# Altium footprint library My_Intlib.PcbLib: 224 footprints (part 11 of 14)
Each footprint in its own frame and in the unit in brackets; x right, y up, seen from the top. Pads: shape width x height; smd on the part's side, far side on the other; paste and mask are expansions set on the pad; w line width, h text height; cw(c..) or ccw(c..) is an arc to the next point about the centre after c.
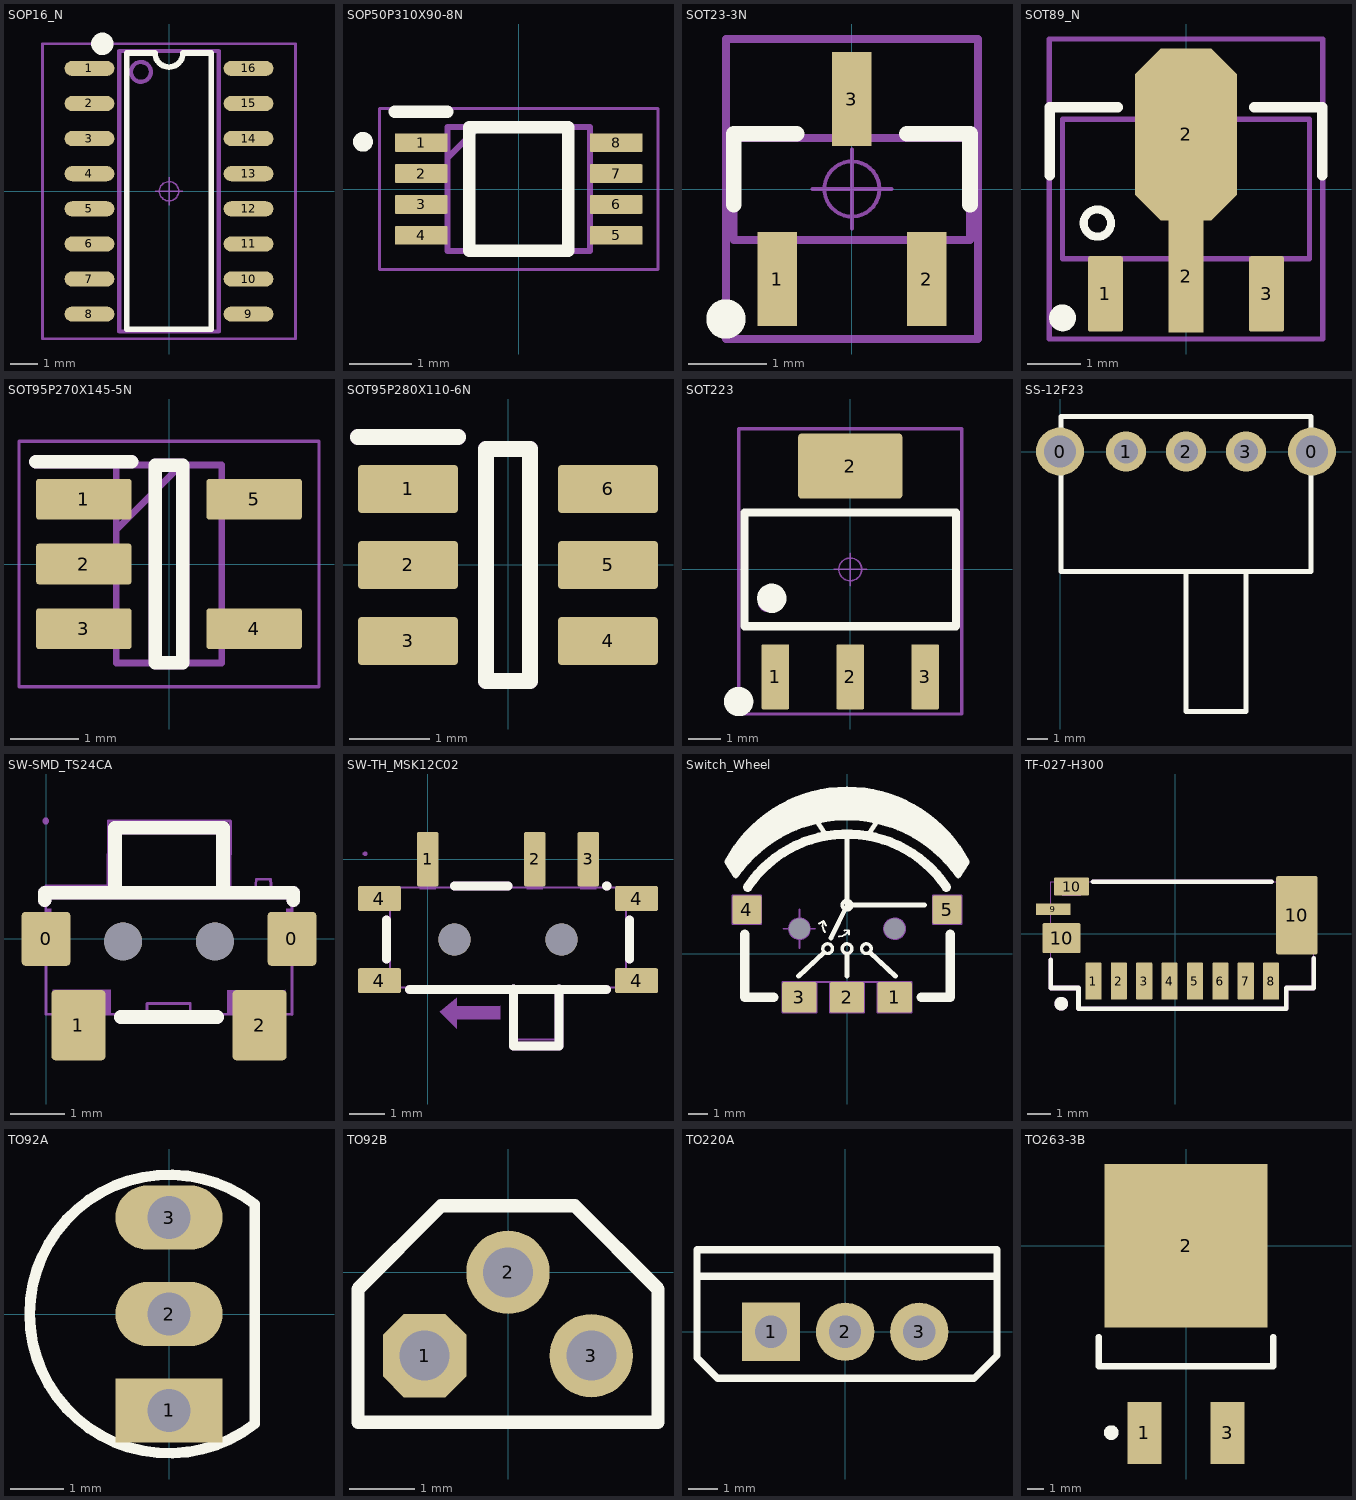
[diagram p10: the footprints below, top view; thin cyan lines are the x and y axes]

## SOP16_N [mm] "10.3*6.2*1.8mm（长宽高）"
height 1.75
pads (16):
  oval 1.8x0.55 smd: 1(-2.877,4.445) 2(-2.877,3.175) 3(-2.877,1.905) 4(-2.877,0.635) 5(-2.877,-0.635) 6(-2.877,-1.905) 7(-2.877,-3.175) 8(-2.877,-4.445) 9(2.877,-4.445) 10(2.877,-3.175) 11(2.877,-1.905) 12(2.877,-0.635) 13(2.877,0.635) 14(2.877,1.905) 15(2.877,3.175) 16(2.877,4.445)
Top Overlay:
  circle w0.5: c-2.413,5.334 r0.155
  lines w0.2: -1.524,5 -1.524,-5 1.524,-5 1.524,5
  lines w0.203: -1.524,5 -0.508,5 ccw(c0,5) 0,4.492 ccw(c0,5) 0.508,5 1.524,5
Top Value:
  text ".Comment" at 4.724,0.532 h0.89
Top Assembly:
  text ".Designator" at 4.724,1.326 h0.89
Mechanical 13:
  circle w0.15: c-1.016,4.318 r0.359
  lines w0.15: -1.8,-5.08 1.8,-5.08 1.8,5.08 -1.8,5.08 -1.8,-5.08
Mechanical 15:
  circle w0.05: c0,0 r0.35
  lines w0.05: -0.5,0 0.5,0 ; 0,-0.5 0,0.5
  lines w0.1: -4.572,-5.334 4.572,-5.334 4.572,5.334 -4.572,5.334 -4.572,-5.334
3D body "SOP16.STEP": height 1.9, standoff 0, extent -3.003,-5 3.003,5

## SOP50P310X90-8N [mm]
pads (8):
  rrect10% 0.85x0.3 smd: 1(-1.575,0.75) 2(-1.575,0.25) 3(-1.575,-0.25) 4(-1.575,-0.75) 5(1.575,-0.75) 6(1.575,-0.25) 7(1.575,0.25) 8(1.575,0.75)
Top Overlay:
  circle w0.16: c-2.515,0.762 r0.08
  lines w0.2: -2,1.25 -1.15,1.25 ; -0.8,-1 -0.8,1 0.8,1 0.8,-1 -0.8,-1
Top Value:
  text ".Comment" at 2.337,-0.154 h0.89
Top Assembly:
  text ".Designator" at 2.337,0.64 h0.89
Mechanical 13:
  lines w0.1: -1.15,0.5 -0.65,1 ; -1.15,-1 -1.15,1 1.15,1 1.15,-1 -1.15,-1
Mechanical 15:
  lines w0.05: -2.25,-1.3 -2.25,1.3 2.25,1.3 2.25,-1.3 -2.25,-1.3
3D body "SN74LVC3G07QDCURQ1.stp": height 0.77, standoff 0, extent -1.55,-1 1.55,1

## SOT23-3N [mm] "3x1.3x1mm(长宽高)"
height 1.1
pads (3):
  rect 0.5x1.2 smd: 1(-0.95,-1.143) 2(0.95,-1.143) 3(0,1.143)
Top Overlay:
  circle w0.25: c-1.6,-1.651 r0.125
  lines w0.2: -1.501,-0.2 -1.501,0.7 -0.701,0.7 ; 0.699,0.7 1.499,0.7 1.499,-0.2
Top Value:
  text ".Comment" at 1.829,-0.458 h0.89
Top Assembly:
  text ".Designator" at 1.829,0.335 h0.89
Mechanical 13:
  lines w0.1: -1.5,-0.65 1.5,-0.65 1.5,0.65 -1.5,0.65 -1.5,-0.65
Mechanical 15:
  circle w0.05: c0,0 r0.35
  lines w0.05: -0.5,0 0.5,0 ; 0,-0.5 0,0.5
  lines w0.1: -1.6,-1.905 1.6,-1.905 1.6,1.905 -1.6,1.905 -1.6,-1.905
3D body "SOT23-3.STEP": height 1.05, standoff 0, extent -1.5,-1.2 1.5,1.2

## SOT89_N [mm] "CJA1117_4.6x4.3x1.6mm(长宽高)"
height 1.6
pads (4):
  rrect10% 0.65x1.4 smd: 1(-1.5,-1.952) 3(1.5,-1.952)
  rect 0.65x2.1 smd: 2(0,-1.626)
  oct 1.9x3.2 smd: 2(0,1.016)
Top Overlay:
  circle w0.25: c-2.3,-2.4 r0.125
  circle w0.15: c-1.651,-0.635 r0.254
  lines w0.2: -2.54,0.254 -2.54,1.524 -1.27,1.524 ; 1.27,1.524 2.54,1.524 2.54,0.254
Top Value:
  text ".Comment" at 3.124,-0.611 h0.89
Top Assembly:
  text ".Designator" at 3.124,0.183 h0.89
Mechanical 13:
  circle w0.1: c-1.651,-0.635 r0.25
  lines w0.1: -2.3,-1.3 2.3,-1.3 2.3,1.3 -2.3,1.3 -2.3,-1.3
Mechanical 15:
  circle w0.05: c0,0 r0.35
  lines w0.05: -0.5,0 0.5,0 ; 0,-0.5 0,0.5
  lines w0.1: -2.55,-2.794 -2.55,2.794 2.55,2.794 2.55,-2.794 -2.55,-2.794
3D body "SOT89.STEP": height 1.6, standoff 0.04, extent -2.3,-2.4 2.3,1.9

## SOT95P270X145-5N [mm]
pads (5):
  rrect15% 1.4x0.6 smd: 1(-1.25,0.95) 2(-1.25,0) 3(-1.25,-0.95) 4(1.25,-0.95) 5(1.25,0.95)
Top Overlay:
  lines w0.2: -1.95,1.5 -0.55,1.5 ; -0.2,-1.45 -0.2,1.45 0.2,1.45 0.2,-1.45 -0.2,-1.45
Top Value:
  text ".Comment" at 2.413,-0.127 h0.89
Top Assembly:
  lines w0.2: -1.95,1.5 -0.55,1.5 ; -0.2,-1.45 -0.2,1.45 0.2,1.45 0.2,-1.45 -0.2,-1.45
  text ".Designator" at 2.337,0.787 h0.89
Mechanical 13:
  lines w0.1: -0.775,0.5 0.175,1.45 ; -0.775,-1.45 -0.775,1.45 0.775,1.45 0.775,-1.45 -0.775,-1.45
Mechanical 15:
  lines w0.05: -2.2,-1.8 -2.2,1.8 2.2,1.8 2.2,-1.8 -2.2,-1.8
3D body "ME6211C33M5G-N.stp": height 1.45, standoff 0, extent -1.35,-1.45 1.35,1.45

## SOT95P280X110-6N [mm]
pads (6):
  rrect15% 1.25x0.6 smd: 1(-1.25,0.95) 2(-1.25,0) 3(-1.25,-0.95) 4(1.25,-0.95) 5(1.25,0) 6(1.25,0.95)
Top Overlay:
  lines w0.2: -1.875,1.6 -0.625,1.6 ; -0.275,-1.45 -0.275,1.45 0.275,1.45 0.275,-1.45 -0.275,-1.45
Top Value:
  text ".Comment" at 2.464,-0.025 h0.89
Top Assembly:
  lines w0.2: -1.875,1.6 -0.625,1.6 ; -0.275,-1.45 -0.275,1.45 0.275,1.45 0.275,-1.45 -0.275,-1.45
  text ".Designator" at 2.388,0.889 h0.89
3D body "LMR51420XFDDCR.stp": height 0.97, standoff 0, extent -1.4,-1.45 1.4,1.45

## SOT223 [mm] "AMS1117_6.4x7x1.6mm(长宽高)"
height 1.7
pads (4):
  rrect10% 0.85x2 smd: 1(-2.3,-3.302) 2(0,-3.302) 3(2.3,-3.302)
  rrect10% 3.2x2 smd: 2(0,3.175)
Top Overlay:
  circle w0.5: c-3.429,-4.064 r0.2
  circle w0.5: c-2.413,-0.889 r0.2
  lines w0.25: -3.25,-1.75 3.25,-1.75 3.25,1.75 -3.25,1.75 -3.25,-1.75
Top Value:
  text ".Comment" at 4.293,-0.052 h0.89
Top Assembly:
  text ".Designator" at 4.293,0.741 h0.89
Mechanical 13:
  circle w0.1: c-2.536,-1.016 r0.25
  lines w0.1: -3.25,-1.75 -3.25,1.75 3.25,1.75 3.25,-1.75 -3.25,-1.75
Mechanical 15:
  circle w0.05: c0,0 r0.35
  lines w0.05: -0.5,0 0.5,0 ; 0,-0.5 0,0.5
  lines w0.1: -3.429,-4.445 -3.429,4.318 3.429,4.318 3.429,-4.445 -3.429,-4.445
3D body "SOT223.STEP": height 1.65, standoff -0.02, extent -3.25,-3.508 3.25,3.508

## SS-12F23 [mm]
pads (5):
  round 2.4 hole 1.6: 0(0,0) 0(12.6,0)
  round 2 hole 1.2: 1(3.3,0) 2(6.3,0) 3(9.3,0)
Top Overlay:
  lines w0.254: 6.3,-6 6.3,-13 9.3,-13 9.3,-6 ; 0.05,-6 0.05,0 0.05,1.75 12.55,1.75 12.55,1.5 12.55,0 12.55,-6 0.05,-6
Top Value:
  text ".Comment" at 13.919,-4.497 h0.89
Top Assembly:
  text ".Designator" at 13.919,-3.704 h0.89
3D body "SS-12F23.STEP": height 5.75, standoff -3.35, extent -0.144,-12.265 12.856,0.635

## SW-SMD_TS24CA [mm] "4.55*1.8*3.5mm 卧贴 轻触开关"
pads (6):
  rrect15% 0.9x1 smd: 0(0,0) 0(4.549,0)
  rrect15% 1x1.3 smd: 1(0.6,-1.597) 2(3.95,-1.597)
  round 0.7 hole 0.7 unplated mask+0: ""(1.425,-0.047) ""(3.125,-0.047)
Top Overlay:
  lines w0.254: -0.025,0.715 -0.025,0.853 4.575,0.853 4.575,0.715 ; 1.275,0.853 1.275,2.053 3.275,2.053 3.275,0.853 ; 1.386,-1.447 3.164,-1.447
Top Value:
  text ".Comment" at 3.632,1.452 h0.89
Top Assembly:
  lines w0.254: -0.025,0.715 -0.025,0.853 4.575,0.853 4.575,0.715 ; 1.275,0.853 1.275,2.053 3.275,2.053 3.275,0.853 ; 1.386,-1.447 3.164,-1.447
  text ".Designator" at 3.632,2.245 h0.89
Mechanical 15:
  region: 0.055,2.18 0.055,2.205 0.02,2.24 -0.03,2.24 -0.065,2.205 -0.065,2.18 -0.065,2.155 -0.03,2.12 0.02,2.12 0.055,2.155
  region: 0.099,-0.097 0,-0.097 0,0.552 0.002,0.553 0.099,0.553 0.099,0.554 0.099,-0.096 0.094,-0.096 0.081,-0.097
  region: 4.439,-0.097 4.549,-0.097 4.549,0.552 4.549,0.553 4.44,0.553 4.44,0.552 4.44,-0.096
  region: 0.12,-0.948 0.12,-1.397 0.37,-1.397 0.37,-1.497 0.769,-1.497 0.769,-1.397 1.199,-1.397 1.199,-0.947 0.12,-0.947 0.12,-0.948
  region: 0.12,-0.948 0.12,-0.955 0.12,-0.948
  region: 4.421,-0.946 4.421,-1.395 4.171,-1.395 4.171,-1.396 4.171,-1.495 3.772,-1.495 3.771,-1.495 3.771,-1.396 3.772,-1.395 3.35,-1.397 3.35,-1.398 3.35,-1.284 3.35,-1.171 3.35,-0.949 3.351,-0.948 4.421,-0.945 4.421,-0.946
  region: 4.421,-0.946 4.421,-0.953 4.42,-0.947
  lines w0.051: 1.868,-1.396 1.869,-1.196 2.669,-1.197 2.67,-1.397 3.77,-1.397 3.77,-1.497 4.169,-1.497 4.169,-1.397 4.419,-1.397 4.549,-1.4 4.549,0.902 4.171,0.905 4.151,1.104 3.89,1.103 3.869,0.903 3.401,0.905 3.413,2.18 1.151,2.18 1.146,0.982 -0.005,0.979 0,-1.398 0.37,-1.397 0.371,-1.496 0.769,-1.496 0.769,-1.397 1.869,-1.396 ; 1.868,-1.396 1.869,-1.396
3D body "SW-SMD_TS24CA.STEP": height 1.87, standoff -0.05, extent 0.011,-1.542 4.561,2.058

## SW-TH_MSK12C02 [mm]
pads (9):
  rrect15% 0.6x1.524 smd: 1(0,0) 2(3,0) 3(4.5,0)
  rrect15% 1.2x0.7 smd: 4(-1.35,-3.4) 4(-1.35,-1.1) 4(5.85,-3.4) 4(5.85,-1.1)
  round 0.9 hole 0.9 unplated mask+0: ""(0.75,-2.25) ""(3.75,-2.25)
Top Overlay:
  lines w0.254: -1.15,-2.8 -1.15,-1.7 ; -0.5,-3.65 5,-3.65 ; 0.75,-0.75 2.25,-0.75 ; 2.4,-3.63 2.4,-5.23 3.675,-5.23 3.675,-3.63 ; 5.009,-0.75 5.019,-0.75 ; 5.65,-2.8 5.65,-1.7
Top Value:
  text ".Comment" at 6.883,-1.779 h0.89
Top Assembly:
  region: 2.035,-4.105 2.035,-4.475 0.815,-4.475 0.815,-4.745 0.345,-4.275 0.815,-3.875 0.815,-4.115
  lines w0.254: -1.15,-2.8 -1.15,-1.7 ; -0.5,-3.65 5,-3.65 ; 0.75,-0.75 2.25,-0.75 ; 2.4,-3.63 2.4,-5.23 3.675,-5.23 3.675,-3.63 ; 5.009,-0.75 5.019,-0.75 ; 5.65,-2.8 5.65,-1.7
  text ".Designator" at 6.883,-0.986 h0.89
Mechanical 15:
  region: 4.275,-0.844 4.275,0.156 4.725,0.156 4.725,-0.844
  region: 2.775,-0.844 2.775,0.156 3.225,0.156 3.225,-0.844
  region: -0.225,-0.844 -0.225,0.156 0.225,0.156 0.225,-0.844
  region: 6.25,-3.531 5.5,-3.531 5.5,-3.081 6.25,-3.081
  region: 6.25,-1.325 5.5,-1.325 5.5,-0.875 6.25,-0.875
  region: -1,-3.531 -1.75,-3.531 -1.75,-3.081 -1,-3.081
  region: -1,-1.325 -1.75,-1.325 -1.75,-0.875 -1,-0.875
  region: -1.69,0.156 -1.69,0.181 -1.725,0.216 -1.775,0.216 -1.81,0.181 -1.81,0.156 -1.81,0.131 -1.775,0.096 -1.725,0.096 -1.69,0.131
  lines w0.051: -1.05,-3.594 -1.05,-0.794 5.55,-0.794 5.55,-3.594 3.75,-3.594 3.75,-5.044 3.05,-5.044 2.35,-5.044 2.35,-3.594 -1.05,-3.594
3D body "SW-TH_MSK12C02.STEP": height 1.51, standoff -0.5, extent -1.633,-5.095 6.167,0.105

## Switch_Wheel [mm] "拨轮开关，3脚，11.8mm*11.8mm*2.4mm"
pads (7):
  rrect10% 1.8x1.6 smd: 1(2.5,-2.3) 2(0,-2.3) 3(-2.5,-2.3)
  rrect10% 1.5x1.5 smd: 4(-5.25,2.3) 5(5.25,2.3)
  round 0 hole 1.1 unplated mask+0: 12(-2.5,1.3) 12(2.5,1.3)
Top Overlay:
  circle w0.178: c1.016,0.254 r0.254
  circle w0.178: c-1.016,0.254 r0.254
  circle w0.178: c0,2.54 r0.254
  circle w0.178: c0,0.254 r0.254
  region: -5.838,4.061 -6.285,4.778 -6.31,4.805 -6.131,5.15 -5.699,5.796 -5.2,6.391 -4.639,6.929 -4.023,7.402 -3.359,7.805 -2.655,8.133 -1.919,8.383 -1.161,8.551 -0.388,8.636 0.388,8.636 1.161,8.551 1.919,8.383 2.655,8.133 3.359,7.805 4.023,7.402 4.639,6.929 5.2,6.391 5.699,5.796 6.131,5.15 6.31,4.805 5.842,4.064 5.838,4.061 5.636,4.338 5.193,4.86 4.702,5.336 4.167,5.764 3.593,6.138 2.986,6.455 2.352,6.712 1.696,6.907 1.024,7.038 0.342,7.104 -0.342,7.104 -1.024,7.038 -1.696,6.907 -2.352,6.712 -2.986,6.455 -3.593,6.138 -4.167,5.764 -4.702,5.336 -5.193,4.86 -5.636,4.338
  lines w0.102: -1.461,1.576 -1.228,1.704 ; -1.151,1.115 cw(c-0.71,1.473) -1.228,1.704 ; -1.099,1.471 -1.228,1.704 ; -0.42,0.899 ccw(c-0.42,1.467) 0.088,1.213 ; -0.124,1.203 0.094,1.22 0.111,1.002
  lines w0.254: -6.31,4.805 cw(c0,1.524) 6.31,4.805 5.842,4.064 ; -6.285,4.778 -5.838,4.061 cw(c0,0) 5.838,4.061 ; -2.543,-1.182 -1.224,0.038 ; -1.524,6.858 -1.016,6.096 ; -0.846,0.805 0,2.54 ; 0,-1.185 0,-0.054 ; 0,6.096 0,2.54 ; 1.016,6.096 1.524,6.858 ; 1.224,0.038 2.543,-1.182 ; 4.064,2.54 0,2.54
  lines w0.5: -5.374,1.002 -5.374,-2.3 -3.85,-2.3 ; -5.22,3.48 cw(c0,0) 5.22,3.48 ; 3.887,-2.3 5.411,-2.3 5.411,1.002
Top Value:
  text ".Comment" at 7.696,0.608 h0.89
Top Assembly:
  text ".Designator" at 7.696,1.402 h0.89
Mechanical 15:
  circle w0.05: c-5.25,2.3 r0.025
  circle w0.1: c2.5,1.3 r0.55
  circle w0.05: c-2.5,1.3 r0.025
  circle w0.05: c-2.5,1.3 r0.025
  circle w0.05: c0,-2.3 r0.025
  circle w0.05: c0,-2.3 r0.025
  circle w0.05: c0,-2.3 r0.025
  circle w0.1: c-2.5,1.3 r0.55
  lines w0.1: -3.324,1.3 -1.676,1.3 ; -2.5,0.29 -2.5,2.31 ; -6,1.55 -4.5,3.05 ; -6,1.55 -6,3.05 ; -6,1.55 -4.5,1.55 ; -6,3.05 -4.5,3.05 ; -6,3.05 -4.5,1.55 ; -4.5,1.55 -4.5,3.05 ; -3.4,-3.1 -1.6,-1.5 ; -3.4,-3.1 -3.4,-1.5 ; -3.4,-3.1 -1.6,-3.1 ; -3.4,-1.5 -0.9,-1.5 ; -3.4,-1.5 -1.6,-3.1 ; -3.4,-1.5 -1.6,-1.5 ; -1.6,-3.1 -1.6,-1.5 ; -0.9,-3.1 0.9,-1.5 ; -0.9,-3.1 -0.9,-1.5 ; -0.9,-3.1 0.9,-3.1 ; -0.9,-1.5 0.9,-1.5 ; -0.9,-1.5 0.9,-3.1 ; -0.9,-1.5 1.6,-1.5 ; 0.9,-3.1 0.9,-1.5 ; 1.6,-3.1 3.4,-1.5 ; 1.6,-3.1 1.6,-1.5 ; 1.6,-3.1 3.4,-3.1 ; 1.6,-1.5 3.4,-1.5 ; 1.6,-1.5 3.4,-3.1 ; 3.4,-3.1 3.4,-1.5 ; 4.5,1.55 4.5,3.05 6,3.05 6,1.55 4.5,1.55
3D body "3D_PCB1_2023-04-09.step": height 2.5, standoff -0.5, extent -5.878,-2.94 5.922,8.81

## TF-027-H300 [mm] "拔插式 MicroSD卡(TF卡) 卡座3mm高 /  HANBO(汉博)"
pads (12):
  rrect10% 0.7x1.6 smd paste+0 mask+0.102: 1(-3.537,-2.05) 2(-2.437,-2.05) 3(-1.337,-2.05) 4(-0.237,-2.05) 5(0.863,-2.05) 6(1.964,-2.05) 7(3.063,-2.05) 8(4.163,-2.05)
  rrect10% 1.5x0.5 smd paste+0 mask+0.102: 9(-5.276,1.06)
  rrect10% 1.65x1.3 smd paste+0 mask+0.102: 10(-4.917,-0.19)
  rrect10% 1.5x0.8 smd paste+0 mask+0.102: 10(-4.487,2.05)
  rrect10% 1.8x3.4 smd: 10(5.277,0.805)
Top Overlay:
  circle w0.305: c-4.934,-3.031 r0.144
  lines w0.203: -5.392,-1.12 -5.392,-2.35 -4.187,-2.35 -4.187,-3.25 4.658,-3.25 ; -3.556,2.25 -3.282,2.25 4.183,2.25 ; 6.018,-1.057 6.018,-2.35 4.818,-2.35 4.818,-3.25 4.658,-3.25 ; 4.658,-3.25 4.658,-3.25
Top Value:
  text ".Comment" at -0.508,-0.204 h0.89
Top Assembly:
  circle w0.305: c-4.934,-3.031 r0.144
  lines w0.203: -5.392,-1.12 -5.392,-2.35 -4.187,-2.35 -4.187,-3.25 4.658,-3.25 ; -3.556,2.25 -3.282,2.25 4.183,2.25 ; 6.018,-1.057 6.018,-2.35 4.818,-2.35 4.818,-3.25 4.658,-3.25 ; 4.658,-3.25 4.658,-3.25
  text ".Designator" at -0.565,0.601 h0.89
Mechanical 15:
  region: 4.763,2.25 5.763,2.25 5.763,-0.75 4.763,-0.75
  region: -4.887,2.25 -4.087,2.25 -4.087,1.65 -4.887,1.65
  region: -5.392,1.232 -4.687,1.232 -4.687,0.887 -5.392,0.887
  region: -5.392,0.355 -4.182,0.355 -4.182,-0.735 -5.392,-0.735
  region: 3.963,-2.5 3.963,-1.85 4.363,-1.85 4.363,-2.5
  region: 2.864,-2.5 2.864,-1.85 3.264,-1.85 3.264,-2.5
  region: 1.764,-2.5 1.764,-1.85 2.164,-1.85 2.164,-2.5
  region: 0.664,-2.5 0.664,-1.85 1.064,-1.85 1.064,-2.5
  region: -0.437,-2.5 -0.437,-1.85 -0.037,-1.85 -0.037,-2.5
  region: -1.537,-2.5 -1.537,-1.85 -1.137,-1.85 -1.137,-2.5
  region: -2.637,-2.5 -2.637,-1.85 -2.236,-1.85 -2.236,-2.5
  region: -3.737,-2.5 -3.737,-1.85 -3.337,-1.85 -3.337,-2.5
  lines w0.051: -5.392,-2.35 -5.392,2.25 6.018,2.25 6.018,-2.35 4.818,-2.35 4.818,-3.25 -4.187,-3.25 -4.187,-2.35 -5.392,-2.35
3D body "TF-027-H300.step": height 3.75, standoff -0.02, extent -5.68,-3.29 5.73,2.21
3D body "TF_Black.STEP": height 3.85, standoff 2.85, extent -5.564,-3.106 5.436,11.894

## TO92A [mm] "92晶体管"
height 5.33
pads (3):
  rect 2x1.2 hole 0.8: 1(0,-1.8)
  oval 2x1.2 hole 0.8: 2(0,0) 3(0,1.8)
Top Overlay:
  lines w0.2: 1.601,-2.049 cw(c0,0) 1.601,2.049 ; 1.6,-1.99 1.6,1.99
3D body "TO92A.STEP": height 7.6, standoff -3, extent -2.3,-2.3 1.3,2.3

## TO92B [mil] "92晶体管"
pads (3):
  oct 50x50 hole 30: 1(-50,-50)
  round 50 hole 30: 2(0,0) 3(50,-50)
Top Overlay:
  lines w8: -90,-90 -90,-10 -40,40 40,40 90,-10 90,-90 -90,-90
3D body "TO92B.STEP": height 118.11, standoff -299.21, extent -90.55,-100.99 90.55,40.55

## TO220A [mm] "220，3脚晶体管"
pads (3):
  rect 2x2 hole 1.1: 1(-2.54,0)
  round 2 hole 1.1: 2(0,0) 3(2.54,0)
Top Overlay:
  lines w0.254: -4.928,1.905 5.131,1.905 ; -5.08,-0.889 -4.369,-1.6 4.42,-1.6 5.207,-0.813 5.207,2.819 -5.08,2.819 -5.08,-0.889
3D body "TO220A.STEP": height 18.5, standoff -4, extent -5.15,-1.53 5.15,2.9

## TO263-3B [mm] "263，3脚晶体管"
pads (3):
  rect 2.1x3.8 smd: 1(-2.54,-11.45) 3(2.54,-11.45)
  rect 10x10 smd: 2(0,0)
Top Overlay:
  circle w0.5: c-4.572,-11.43 r0.2
  lines w0.381: -5.334,-5.588 -5.334,-7.366 5.334,-7.366 5.334,-5.588
3D body "TO263.STEP": height 4.5, standoff -0.01, extent -5,-11.463 5,3.467